# Altium footprint library LimeMicroAltiumLib_pcbLib.PcbLib: 281 footprints (part 14 of 18)
Each footprint in its own frame and in the unit in brackets; x right, y up, seen from the top. Pads: shape width x height; smd on the part's side, far side on the other; paste and mask are expansions set on the pad; w line width, h text height; cw(c..) or ccw(c..) is an arc to the next point about the centre after c.
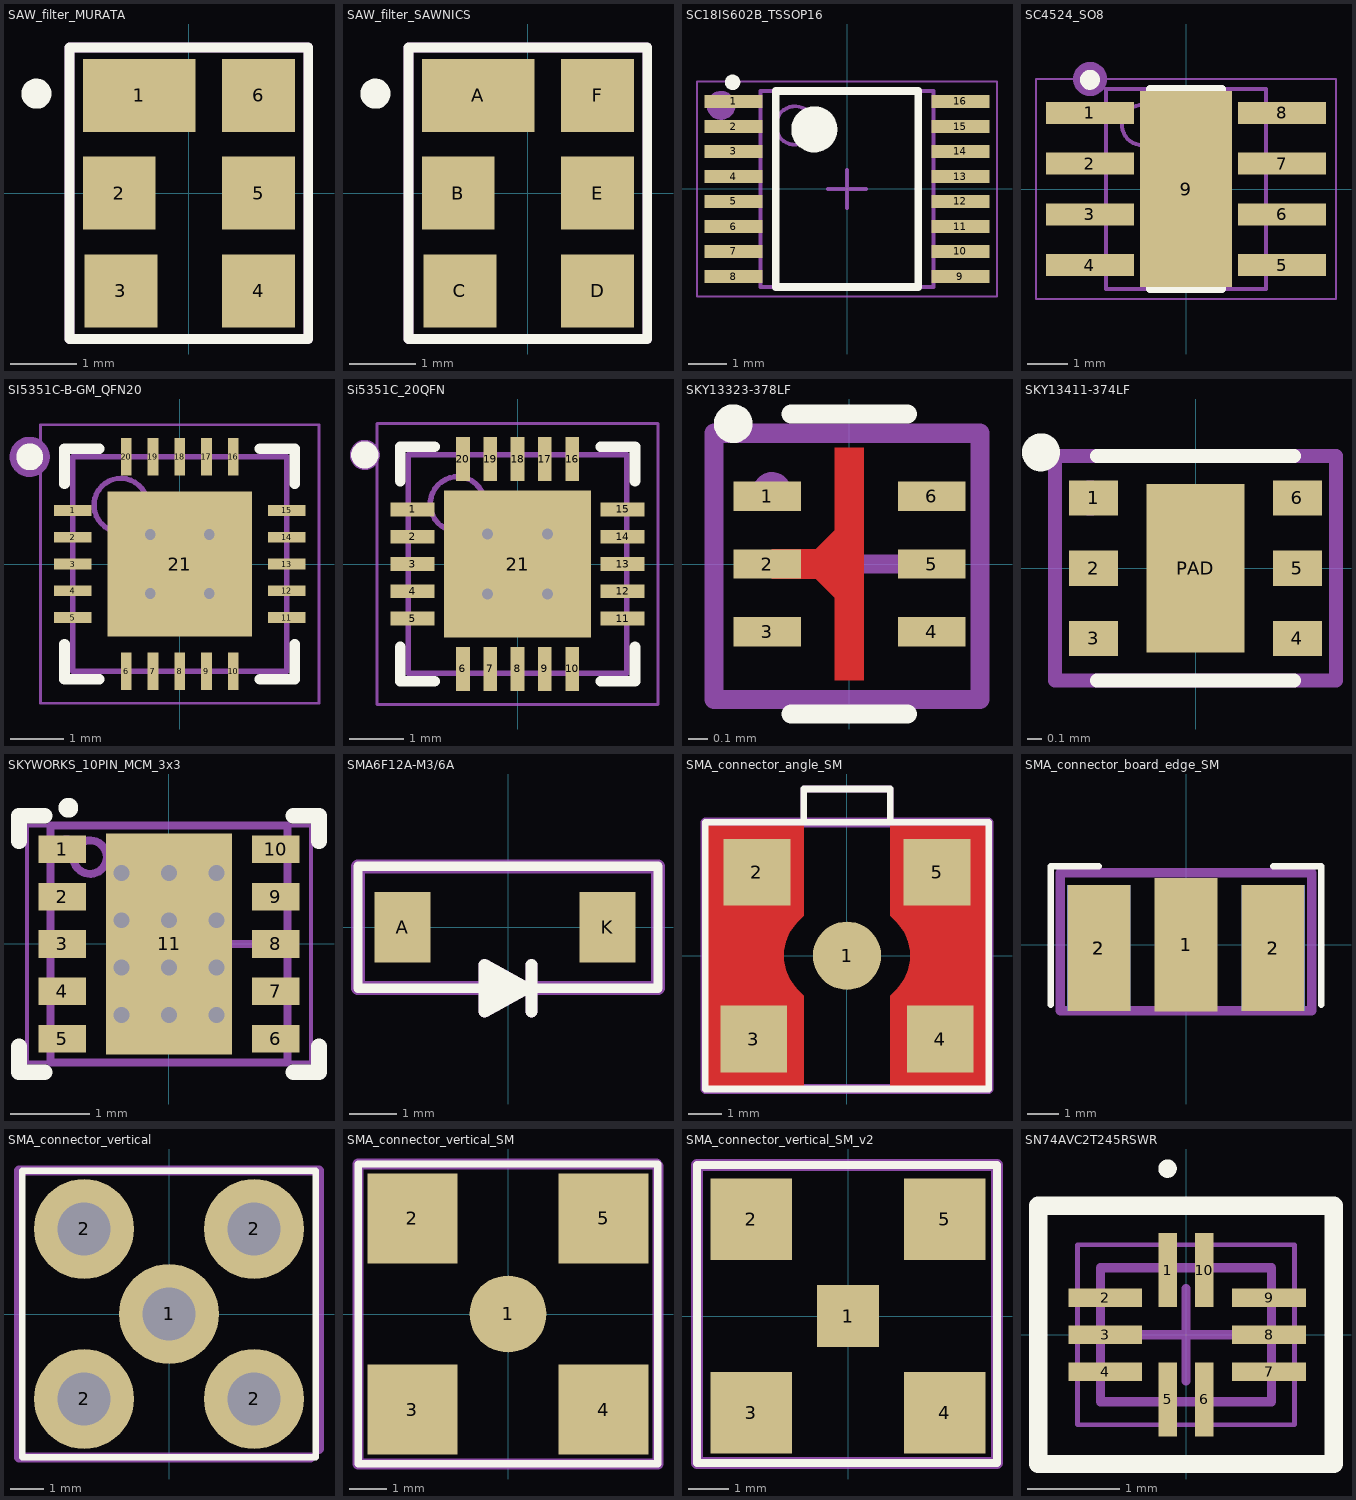
[diagram p13: the footprints below, top view; thin cyan lines are the x and y axes]

## SAW_filter_MURATA [mm]
pads (6):
  rect 1.7x1.1 smd: 1(-0.75,1.475)
  rect 1.1x1.1 smd: 2(-1.05,0) 3(-1.025,-1.475) 4(1.05,-1.475) 5(1.05,0) 6(1.05,1.475)
Top Overlay:
  circle w0.254: c-2.3,1.5 r0.1
  lines w0.15: -1.8,-2.2 -1.8,2.2 1.8,2.2 1.8,-2.2 -1.8,-2.2
Mechanical 15:
  circle w0.254: c-0.8,1.5 r0.1
  lines w0.15: -1.8,-2.2 1.8,-2.2 1.8,2.2 -1.8,2.2 -1.8,-2.2
  text ".Designator" at 0,0 h0.7
3D body "SW3dPS-DCC6C.STEP": height 1.14, standoff -0.09, extent -1.475,-1.475 1.525,1.525

## SAW_filter_SAWNICS [mm]
pads (6):
  rect 1.7x1.1 smd: A(-0.75,1.475)
  rect 1.1x1.1 smd: B(-1.05,0) C(-1.025,-1.475) D(1.05,-1.475) E(1.05,0) F(1.05,1.475)
Top Overlay:
  circle w0.254: c-2.3,1.5 r0.1
  lines w0.15: -1.8,-2.2 1.8,-2.2 1.8,2.2 -1.8,2.2 -1.8,-2.2
Mechanical 15:
  circle w0.254: c-0.8,1.5 r0.1
  lines w0.15: -1.8,-2.2 -1.8,2.2 1.8,2.2 1.8,-2.2 -1.8,-2.2
  text ".Designator" at 0,0 h0.7
3D body "SW3dPS-DCC6C.STEP": height 1.14, standoff -0.09, extent -1.475,-1.475 1.525,1.525

## SC18IS602B_TSSOP16 [mm]
pads (16):
  rect 1.5x0.35 smd: 1(-2.95,2.275) 2(-2.95,1.625) 3(-2.95,0.975) 4(-2.95,0.325) 5(-2.95,-0.325) 6(-2.95,-0.975) 7(-2.95,-1.625) 8(-2.95,-2.275) 9(2.95,-2.275) 10(2.95,-1.625) 11(2.95,-0.975) 12(2.95,-0.325) 13(2.95,0.325) 14(2.95,0.975) 15(2.95,1.625) 16(2.95,2.275)
Top Overlay:
  circle w0.25: c-2.975,2.775 r0.075
  circle w0.6: c-0.85,1.55 r0.3
  lines w0.2: -1.85,-2.55 -1.85,2.55 1.85,2.55 1.85,-2.55 -1.85,-2.55
Mechanical 13:
  circle w0.1: c-1.35,1.65 r0.5
  lines w0.1: -2.25,-2.55 -2.25,2.55 2.25,2.55 2.25,-2.55 -2.25,-2.55
Mechanical 15:
  circle w0.35: c-3.275,2.175 r0.2
  lines w0.05: -3.9,-2.8 -3.9,2.8 3.9,2.8 3.9,-2.8 -3.9,-2.8
  lines w0.1: -0.5,0 0.5,0 ; 0,-0.5 0,0.5
  text ".Designator" at 0,0 h0.7
3D body "User Library-TSSOP-16-1.step": height 1.1, standoff 0, extent -3.2,-2.5 3.2,2.5

## SC4524_SO8 [mm] "SOIC, 8-Leads, Body 4,90x3,90mm, Pitch 1,27mm, IPC Medium Density"
height 1.7
pads (9):
  rect 2.2x0.55 smd mask+0.05: 1(-2.4,1.905) 2(-2.4,0.635) 3(-2.4,-0.635) 4(-2.4,-1.905) 5(2.4,-1.905) 6(2.4,-0.635) 7(2.4,0.635) 8(2.4,1.905)
  rect 2.3x4.9 smd mask+0.05: 9(0,0)
Top Overlay:
  circle w0.25: c-2.4,2.73 r0.125
  lines w0.2: -0.9,-2.5 -0.9,2.5 0.9,2.5 0.9,-2.5 -0.9,-2.5
Mechanical 13:
  circle w0.1: c-1.1,1.6 r0.5
  lines w0.1: -2,-2.5 -2,2.5 2,2.5 2,-2.5 -2,-2.5
Mechanical 15:
  circle w0.35: c-2.4,2.75 r0.25
  lines w0.05: -3.75,-2.75 -3.75,2.75 3.75,2.75 3.75,-2.75 -3.75,-2.75
  lines w0.1: -0.5,0 0.5,0 ; 0,-0.5 0,0.5
  text ".Designator" at 0,-0.1 h0.7
3D body "CircuitWorks-SO-8.step": height 1.45, standoff 0, extent -2.9,-2.402 2.878,2.5

## SI5351C-B-GM_QFN20 [mm] "QFN, 20-Leads, Body 4,00x4,00mm, Pitch 0,50mm, Thermal Pad 2,70x2,70mm, IPC Medium Density"
height 0.85
pads (21):
  rect 0.7x0.2 smd: 1(-2,1) 2(-2,0.5) 3(-2,0) 4(-2,-0.5) 5(-2,-1) 11(2,-1) 12(2,-0.5) 13(2,0) 14(2,0.5) 15(2,1)
  rect 0.2x0.7 smd: 6(-1,-2) 7(-0.5,-2) 8(0,-2) 9(0.5,-2) 10(1,-2) 16(1,2) 17(0.5,2) 18(0,2) 19(-0.5,2) 20(-1,2)
  rect 2.7x2.7 smd: 21(0,0)
via -0.55,0.55 diameter 0.5 hole 0.2
via 0.55,0.55 diameter 0.5 hole 0.2
via -0.55,-0.55 diameter 0.5 hole 0.2
via 0.55,-0.55 diameter 0.5 hole 0.2
Top Overlay:
  circle w0.25: c-2.8,2 r0.125
  lines w0.2: -2.15,-1.5 -2.15,-2.15 -1.5,-2.15 ; -2.15,1.5 -2.15,2.15 -1.5,2.15 ; 1.5,-2.15 2.15,-2.15 2.15,-1.5 ; 1.5,2.15 2.15,2.15 2.15,1.5
Mechanical 13:
  circle w0.1: c-1.1,1.1 r0.5
  lines w0.1: -2,-2 -2,2 2,2 2,-2 -2,-2
Mechanical 15:
  circle w0.35: c-2.8,2 r0.2
  lines w0.05: -2.6,-2.6 -2.6,2.6 2.6,2.6 2.6,-2.6 -2.6,-2.6
  lines w0.1: -0.5,0 0.5,0 ; 0,-0.5 0,0.5
  text ".Designator" at 0,0 h0.7
3D body "User Library-QFN4x4_20pins.step": height 0.8, standoff 0, extent -2.02,-2.02 2.02,2.02

## Si5351C_20QFN [mm] "QFN, 20-Leads, Body 4,00x4,00mm, Pitch 0,50mm, Thermal Pad 2,70x2,70mm, IPC Medium Density"
height 0.8
pads (21):
  rect 0.8x0.25 smd mask+0.05: 1(-1.925,1) 2(-1.925,0.5) 3(-1.925,0) 4(-1.925,-0.5) 5(-1.925,-1) 11(1.925,-1) 12(1.925,-0.5) 13(1.925,0) 14(1.925,0.5) 15(1.925,1)
  rect 0.25x0.8 smd mask+0.05: 6(-1,-1.925) 7(-0.5,-1.925) 8(0,-1.925) 9(0.5,-1.925) 10(1,-1.925) 16(1,1.925) 17(0.5,1.925) 18(0,1.925) 19(-0.5,1.925) 20(-1,1.925)
  rect 2.7x2.7 smd mask+0.05: 21(0,0)
via 0.55,-0.55 diameter 0.4 hole 0.2
via -0.55,-0.55 diameter 0.4 hole 0.2
via 0.55,0.55 diameter 0.4 hole 0.2
via -0.55,0.55 diameter 0.4 hole 0.2
Top Overlay:
  circle w0.25: c-2.8,2 r0.125
  lines w0.2: -2.15,-1.525 -2.15,-2.15 -1.525,-2.15 ; -2.15,1.525 -2.15,2.15 -1.525,2.15 ; 1.525,-2.15 2.15,-2.15 2.15,-1.525 ; 1.525,2.15 2.15,2.15 2.15,1.525
Mechanical 13:
  circle w0.1: c-1.1,1.1 r0.5
  lines w0.1: -2,-2 2,-2 2,2 -2,2 -2,-2
Mechanical 15:
  circle w0.35: c-2.8,2 r0.1
  lines w0.05: -2.575,-2.575 2.575,-2.575 2.575,2.575 -2.575,2.575 -2.575,-2.575
  lines w0.1: -0.5,0 0.5,0 ; 0,-0.5 0,0.5
  text ".Designator" at 0,0 h0.7
3D body "User Library-QFN4x4_20pins.step": height 0.8, standoff 0, extent -2.02,-2.02 2.02,2.02

## SKY13323-378LF [mm] "SKY13323-378LF RF switch"
pads (6):
  rect 0.35x0.15 smd mask+0.05: 1(-0.425,0.35) 2(-0.425,0) 3(-0.425,-0.35) 4(0.425,-0.35) 5(0.425,0) 6(0.425,0.35)
Top Layer:
  region: -0.4,0.075 -0.175,0.075 -0.075,0.175 -0.075,0.6 0.075,0.6 0.075,0 -0.4,0
  region: -0.4,-0.075 -0.175,-0.075 -0.075,-0.175 -0.075,-0.6 0.075,-0.6 0.075,0 -0.4,0
Top Overlay:
  circle w0.1: c-0.6,0.725 r0.05
  lines w0.1: -0.3,-0.775 0.3,-0.775 ; -0.3,0.775 0.3,0.775
Top Paste:
  region: -0.05,-0.575 0.05,-0.575 0.05,-0.1 -0.05,-0.1
  region: -0.05,0.575 0.05,0.575 0.05,0.1 -0.05,0.1
Mechanical 15:
  circle w0.1: c-0.4,0.375 r0.05
  lines w0.1: -0.25,0 0,0 ; 0,-0.25 0,0 ; 0,0.25 0,0 ; 0.25,0 0,0 ; -0.7,-0.7 0.675,-0.7 0.675,0.675 -0.7,0.675 -0.7,-0.7
  text ".Designator" at 0,0 h0.55
3D body: height 0.5, standoff 0, extent -0.5,-0.5 0.5,0.5
3D body: height 0.51, standoff 0.5, extent -0.425,0.225 -0.225,0.425

## SKY13411-374LF [mm]
pads (7):
  rect 0.35x0.25 smd mask+0.05: 1(-0.725,0.5) 2(-0.725,0) 3(-0.725,-0.5) 4(0.725,-0.5) 5(0.725,0) 6(0.725,0.5)
  rect 0.7x1.2 smd mask+0.05: PAD(0,0)
Top Overlay:
  circle w0.2: c-1.1,0.825 r0.035
  lines w0.1: -0.7,-0.8 0.7,-0.8 ; -0.7,0.8 0.7,0.8
Mechanical 15:
  circle w0.2: c-0.75,0.5 r0.025
  lines w0.1: -0.2,0 0.2,0 ; 0,-0.2 0,0.2 ; -1,-0.8 1,-0.8 1,0.8 -1,0.8 -1,-0.8
  text ".Designator" at 0,0 h0.55
3D body "User Library-DFN 6 2x2_v2.STEP": height 0.48, standoff -0.03, extent -0.752,-0.75 0.751,0.75

## SKYWORKS_10PIN_MCM_3x3 [mm]
height 0.8
pads (11):
  rect 0.6x0.35 smd: 1(-1.35,1.2) 2(-1.35,0.6) 3(-1.35,0) 4(-1.35,-0.6) 5(-1.35,-1.2) 6(1.35,-1.2) 7(1.35,-0.6) 8(1.35,0) 9(1.35,0.6) 10(1.35,1.2)
  rect 1.6x2.8 smd mask+0.05: 11(0,0)
via -0.6,-0.9 diameter 0.4 hole 0.2
via 0,-0.9 diameter 0.4 hole 0.2
via 0.6,-0.9 diameter 0.4 hole 0.2
via -0.6,-0.3 diameter 0.4 hole 0.2
via 0.6,-0.3 diameter 0.4 hole 0.2
via 0,-0.3 diameter 0.4 hole 0.2
via -0.6,0.3 diameter 0.4 hole 0.2
via 0,0.3 diameter 0.4 hole 0.2
via 0.6,0.3 diameter 0.4 hole 0.2
via -0.6,0.9 diameter 0.4 hole 0.2
via 0,0.9 diameter 0.4 hole 0.2
via 0.6,0.9 diameter 0.4 hole 0.2
Top Overlay:
  circle w0.2: c-1.275,1.725 r0.025
  lines w0.2: -1.9,-1.3 -1.9,-1.625 -1.575,-1.625 ; -1.9,1.3 -1.9,1.625 -1.575,1.625 ; 1.575,-1.625 1.9,-1.625 1.9,-1.3 ; 1.575,1.625 1.9,1.625 1.9,1.3
Mechanical 13:
  circle w0.1: c-1,1.1 r0.212
  lines w0.1: -1.5,-1.5 1.5,-1.5 1.5,1.5 -1.5,1.5 -1.5,-1.5
Mechanical 15:
  circle w0.35: c-1.3,1.2 r0
  lines w0.05: -1.8,-1.5 1.8,-1.5 1.8,1.5 -1.8,1.5 -1.8,-1.5
  lines w0.1: 0.1,0 1.1,0 ; 0.6,-0.5 0.6,0.5
  text ".Designator" at 0,0 h0.7
3D body: height 0.9, standoff 0, extent -1.5,-1.5 1.5,1.5

## SMA6F12A-M3/6A [mm]
pads (2):
  rect 1.2x1.5 smd: A(-2.25,0) K(2.125,0)
Top Overlay:
  lines w0.2: -3.2,-1.3 3.2,-1.3 3.2,1.3 -3.2,1.3 -3.2,-1.3
  lines w0.254: -0.5,-1.5 -0.1,-1.5 ; -0.5,-1.3 -0.3,-1.3 0.4,-1.3 ; -0.5,-1.1 0,-1.1 ; 0.5,-1.8 0.5,-0.8 ; 0.4,-1.3 -0.5,-0.8 -0.5,-1.8 0.4,-1.3
Mechanical 15:
  lines w0.254: -0.5,-1.5 -0.1,-1.5 ; -0.5,-1.3 -0.3,-1.3 0.4,-1.3 ; -0.5,-1.1 0,-1.1 ; 0.5,-1.8 0.5,-0.8 ; 0.4,-1.3 -0.5,-1.8 -0.5,-0.8 0.4,-1.3
  lines w0.3: -3.2,-1.3 -3.2,1.3 3.2,1.3 3.2,-1.3 -3.2,-1.3
  text "A" at -2.7,-0.8 h1.5
  text "C" at 1.7,-0.8 h1.5
  text ".Designator" at 0,0 h0.7

## SMA_connector_angle_SM [mm]
pads (5):
  round 2.05 smd: 1(0,0)
  rect 2x2 smd: 2(-2.7,2.5) 3(-2.8,-2.5) 4(2.8,-2.5) 5(2.7,2.5)
Top Layer:
  region: -1.3,-3.9 -4.2,-3.9 -4.2,3.9 -1.3,3.9 -1.3,1.2 -1.476,1.024 -1.571,0.919 -1.729,0.683 -1.838,0.42 -1.893,0.142 -1.9,0 -1.893,-0.142 -1.838,-0.42 -1.729,-0.683 -1.571,-0.919 -1.476,-1.024 -1.3,-1.2
  region: 1.3,-3.9 4.2,-3.9 4.2,3.9 1.3,3.9 1.3,1.2 1.476,1.024 1.571,0.919 1.729,0.683 1.838,0.42 1.893,0.142 1.9,0 1.893,-0.142 1.838,-0.42 1.729,-0.683 1.571,-0.919 1.476,-1.024 1.3,-1.2
Top Overlay:
  lines w0.2: -1.3,4 -1.3,5 1.3,5 1.3,4 ; -4.25,-4 4.25,-4 4.25,4 -4.25,4 -4.25,-4
Mechanical 15:
  lines w0.1: -4.25,-4 -4.25,4 4.25,4 4.25,-4 -4.25,-4
  lines w0.2: -1.3,4 -1.3,5 1.3,5 1.3,4
  lines w0.3: -4.25,-4 4.25,-4 4.25,4 -4.25,4 -4.25,-4
  text ".Designator" at 0,0 h0.7
3D body "User Library-Con, 142-0711-201.STEP": height 8.84, standoff 0, extent -3.233,-3.233 3.234,3.234

## SMA_connector_board_edge_SM [mm]
pads (5):
  rect 2x4.25 smd: 1(0,0)
  rect 2x4 smd: 2(-2.77,-0.1) 2(2.77,-0.1)
  rect 2x4 smd far side: 2(-2.77,-0.1) 2(2.77,-0.1)
Top Overlay:
  lines w0.2: -4.3,-1.9 -4.3,2.5 -2.775,2.5 ; 2.775,2.5 4.3,2.5 4.3,-1.9
Mechanical 15:
  lines w0.3: -4,-2.1 4,-2.1 4,2.3 -4,2.3 -4,-2.1
  text ".Designator" at 0,0 h0.7
3D body "User Library-620-SMA-02-112-TGG SMA Female for PCB edge Mount.step": height 3.4, standoff -2.65, extent -3,-11.8 3,1.8

## SMA_connector_vertical [mm]
pads (5):
  round 3 hole 1.6: 1(0,0) 2(-2.55,-2.55) 2(-2.55,2.55) 2(2.55,-2.55) 2(2.55,2.55)
Top Overlay:
  lines w0.2: -4.4,-4.3 -4.4,4.3 4.4,4.3 4.4,-4.3 -4.4,-4.3
Mechanical 15:
  lines w0.1: -4.25,-4.3 4.25,-4.3 ; 4.5,-4.05 4.5,4
  lines w0.3: 4.25,-4.3 -4.5,-4.3 -4.5,4.3 4.5,4.3 4.5,-4.05
  text ".Designator" at 0,0 h0.7
3D body "User Library-SMA_Stehend_Amp 132134RP-1.STEP": height 9.53, standoff -3.94, extent -3.5,-3.5 3.5,3.5

## SMA_connector_vertical_SM [mm]
pads (5):
  round 2.05 smd: 1(0,0)
  rect 2.4x2.4 smd: 2(-2.55,2.55) 3(-2.55,-2.55) 4(2.55,-2.55) 5(2.55,2.55)
Top Overlay:
  lines w0.2: -4,-4 -4,4 4,4 4,-4 -4,-4
Mechanical 15:
  lines w0.1: -4,4 3.95,4
  lines w0.3: 3.95,4 -4,4 -4,-4 4,-4 4,3.95
  text ".Designator" at 0,0 h0.7
3D body "User Library-Con, 142-0711-201.STEP": height 8.84, standoff 0, extent -3.233,-3.233 3.234,3.234

## SMA_connector_vertical_SM_v2 [mm]
pads (5):
  rect 1.52x1.52 smd: 1(0,0)
  rect 2x2 smd: 2(-2.37,2.37) 3(-2.37,-2.37) 4(2.37,-2.37) 5(2.37,2.37)
Top Overlay:
  lines w0.2: -3.7,-3.6 3.65,-3.6 3.65,3.7 -3.7,3.7 -3.7,-3.6
Mechanical 15:
  lines w0.3: -3.7,-3.6 -3.7,3.7 3.65,3.7 3.65,-3.6 -3.7,-3.6
  text ".Designator" at 0,0 h0.7
3D body "User Library-Con, 142-0711-201.STEP": height 8.84, standoff 0, extent -3.233,-3.233 3.234,3.234

## SN74AVC2T245RSWR [mm] "PQFN, 10-Leads, Body 1,80x1,40mm, Pitch 0,40mm, IPC Medium Density"
height 0.55
pads (10):
  rect 0.2x0.8 smd: 1(-0.2,0.7) 5(-0.2,-0.7) 6(0.2,-0.7) 10(0.2,0.7)
  rect 0.8x0.2 smd: 2(-0.875,0.4) 3(-0.875,0) 4(-0.875,-0.4) 7(0.9,-0.4) 8(0.9,0) 9(0.9,0.4)
Top Overlay:
  circle w0.1: c-0.2,1.8 r0.05
  lines w0.2: -1.6,-1.4 1.6,-1.4 1.6,1.4 -1.6,1.4 -1.6,-1.4
Mechanical 13:
  lines w0.1: -0.925,-0.725 0.925,-0.725 0.925,0.725 -0.925,0.725 -0.925,-0.725
Mechanical 15:
  lines w0.05: -1.175,-0.975 1.175,-0.975 1.175,0.975 -1.175,0.975 -1.175,-0.975
  lines w0.1: -0.5,0 0.5,0 ; 0,-0.5 0,0.5
  text ".Designator" at 0,0 h0.7
3D body: height 0.55, standoff 0, extent -0.925,-0.725 0.925,0.725